# Altium footprint library 晶体管封装库.PcbLib: 101 footprints (part 6 of 7)
Each footprint in its own frame and in the unit in brackets; x right, y up, seen from the top. Pads: shape width x height; smd on the part's side, far side on the other; paste and mask are expansions set on the pad; w line width, h text height; cw(c..) or ccw(c..) is an arc to the next point about the centre after c.
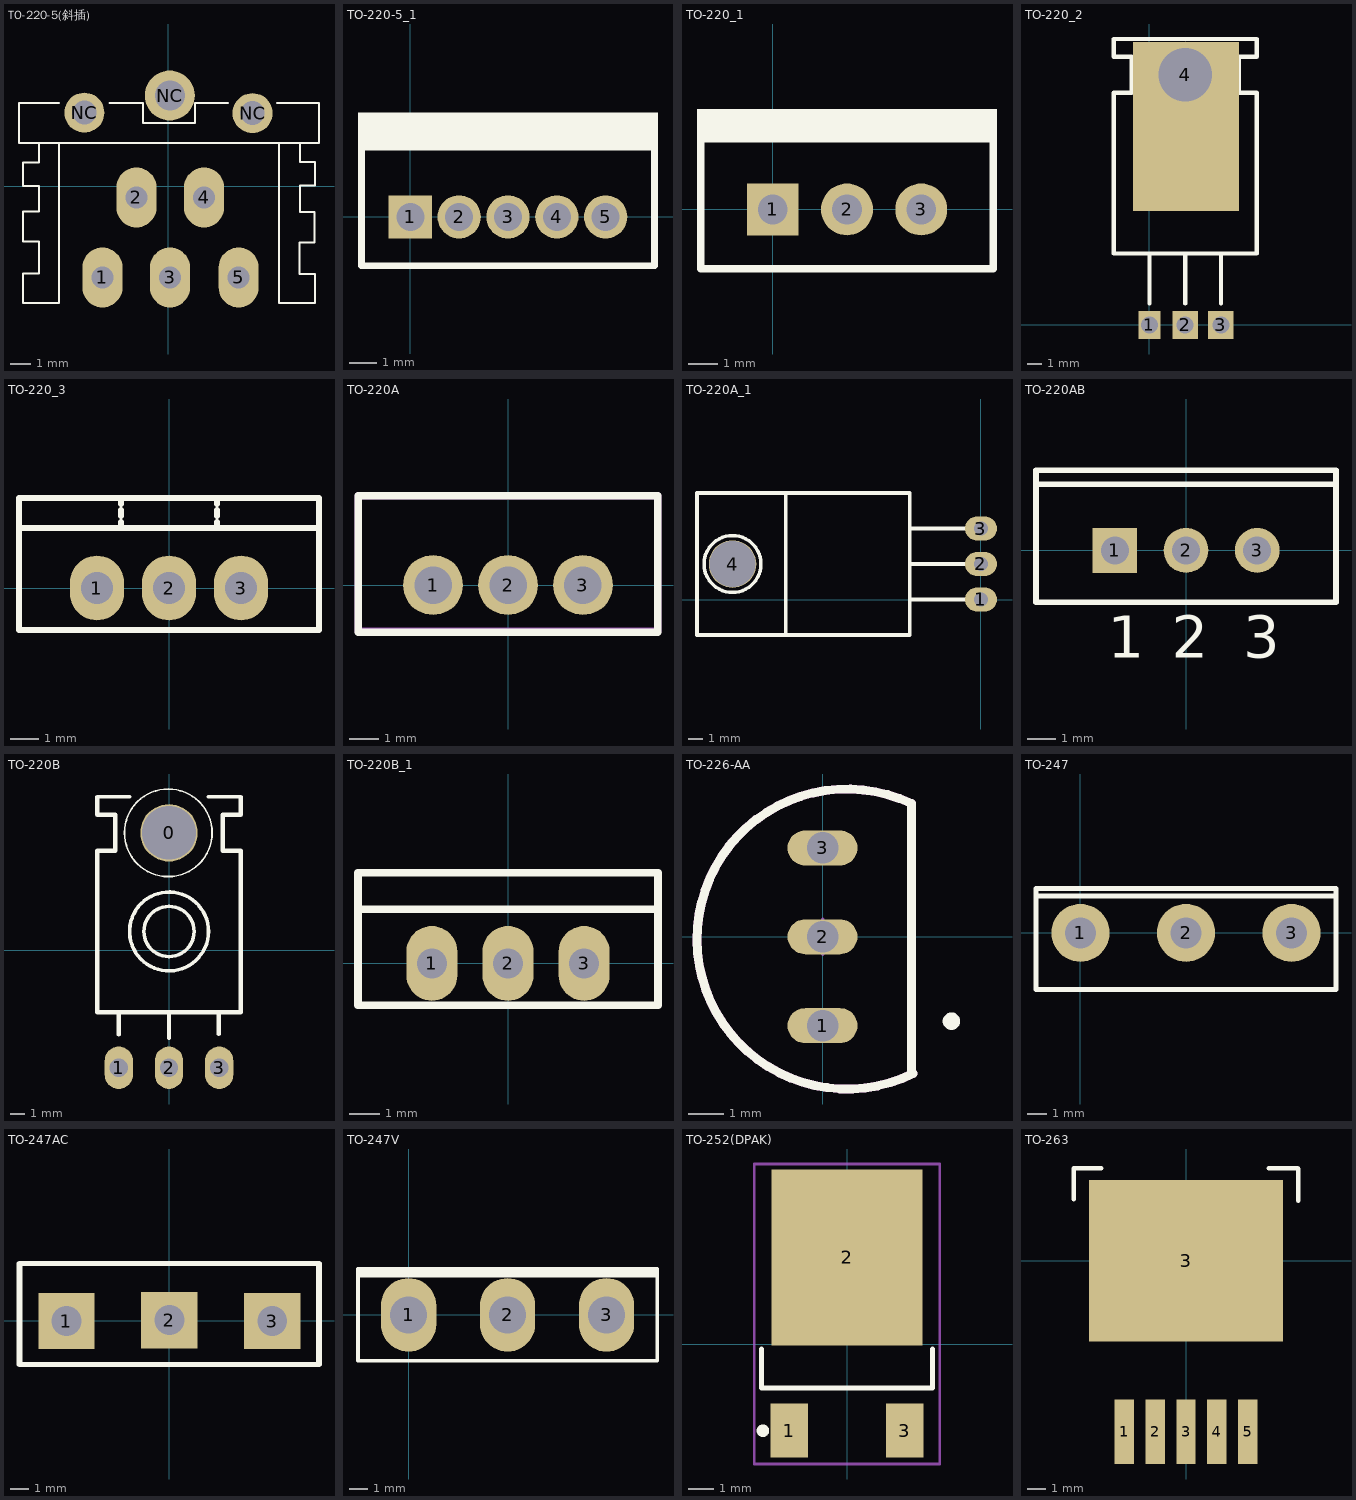
[diagram p5: the footprints below, top view; thin cyan lines are the x and y axes]

## TO-220-5(斜插) [mm]
pads (8):
  oval 2x3 hole 1.1: 1(-3.302,-4.549) 2(-1.602,-0.549) 3(0.076,-4.549) 4(1.778,-0.549) 5(3.505,-4.549)
  round 2 hole 1.2: NC(-4.204,3.696) NC(4.204,3.67)
  round 2.5 hole 1.5: NC(0.064,4.549)
Top Overlay:
  lines w0.1: -7.474,2.963 -7.474,2.179 ; -6.464,2.154 -6.464,1.206 -7.277,1.206 -7.277,0.013 -6.464,0.013 -6.464,-1.257 -7.277,-1.257 -7.277,-2.756 -6.464,-2.756 -6.464,-4.356 -7.277,-4.356 -7.277,-5.821 -5.474,-5.821 -5.474,2.179 ; -5.475,4.179 -7.474,4.179 -7.474,2.179 ; -4.674,4.179 -4.674,3.188 -4.666,3.179 -3.674,3.179 -3.674,4.179 ; -2.959,4.178 -1.283,4.178 ; -1.274,4.179 -1.274,3.179 1.326,3.179 ; 1.326,3.188 1.326,4.178 2.984,4.178 ; 3.726,4.179 3.726,3.188 4.718,3.188 4.726,3.179 4.726,4.179 ; 5.422,4.179 7.526,4.179 7.526,2.179 -7.474,2.179 ; 5.524,2.179 5.524,-5.821 7.328,-5.821 7.328,-4.381 6.54,-4.381 6.54,-2.807 7.302,-2.807 7.302,-1.283 6.566,-1.283 6.566,0.038 7.328,0.038 7.328,1.232 6.566,1.232 6.566,2.154
3D body: height 9, standoff 8, extent 1.194,-0.787 2.362,-0.381
3D body: height 9, standoff 8, extent -2.184,-0.762 -1.016,-0.356
3D body: height 8, standoff -2.1, extent 1.397,-0.787 2.159,-0.381
3D body: height 8, standoff -2.1, extent -1.981,-0.762 -1.219,-0.356
3D body: height 3.5, standoff -2.1, extent 3.124,-4.775 3.886,-4.369
3D body: height 23.5, standoff 17.5, extent -5.512,0.686 5.537,2.197
3D body: height 17.5, standoff 9, extent -5.486,-2.845 5.524,2.21
3D body: height 3.5, standoff -2.1, extent -3.683,-4.775 -2.921,-4.369
3D body: height 9, standoff 8, extent -3.912,-0.787 -2.743,-0.381
3D body: height 3.5, standoff -2.1, extent -0.305,-4.75 0.457,-4.343
3D body: height 9, standoff 8, extent -0.508,-0.762 0.66,-0.356
3D body: height 9, standoff 8, extent 2.921,-0.787 4.089,-0.381
3D body: height 25, standoff 0, extent -7.455,2.172 7.506,4.178
3D body: height 0, standoff -4, extent -4.686,3.188 -3.69,4.186
3D body: height 0, standoff -4, extent 3.746,3.213 4.743,4.211
3D body: height 25, standoff 0, extent -7.302,-5.829 -5.474,2.222
3D body: height 25, standoff 0, extent 5.524,-5.829 7.353,2.197
3D body: height 18.5, standoff 15.5, extent -1.422,1.648 1.566,4.648
3D body: height 3.5, standoff 3, extent -3.683,-4.775 -2.921,-0.381
3D body: height 3.5, standoff 3, extent 3.124,-4.775 3.886,-0.381
3D body: height 3.5, standoff 3, extent -0.305,-4.75 0.457,-0.356
3D body: height 8, standoff 3.5, extent -3.683,-0.787 -2.921,-0.381
3D body: height 8, standoff 3.5, extent -0.305,-0.762 0.457,-0.356
3D body: height 8, standoff 3.5, extent 3.124,-0.787 3.886,-0.381
3D body: height 2, standoff -4, extent -0.707,3.798 0.787,5.295

## TO-220-5_1 [mil]
pads (5):
  rect 62x62 hole 40: 1(0,0)
  round 62 hole 40: 2(70,0) 3(140,0) 4(210,0) 5(280,0)
Top Overlay:
  rectangle: -75,100 355,150
  lines w10: -70,-70 350,-70 350,100 -70,100 -70,-70

## TO-220_1 [mil]
pads (3):
  rect 70x70 hole 40: 1(0,0)
  round 70 hole 40: 2(100,0) 3(200,0)
Top Overlay:
  rectangle: -102,95 302,135
  lines w10: -97,-80 297,-80 297,95 -97,95 -97,-80

## TO-220_2 [mm]
pads (5):
  rect 1.575x2 hole 1.2: 1(0,0)
  rect 1.8x2 hole 1.2: 2(2.54,0) 3(5.08,0)
  round 4.7 hole 3.8: 4(2.54,17.78)
  rect 7.5x12 smd: ""(2.6,14.1)
Top Overlay:
  lines w0.305: 0,1.524 0,5.08 ; 2.54,1.524 2.54,5.08 ; 5.08,1.524 5.08,5.08 ; -2.54,5.08 7.62,5.08 7.62,16.51 6.35,16.51 6.35,19.05 7.62,19.05 7.62,20.32 -2.54,20.32 -2.54,19.05 -1.27,19.05 -1.27,16.51 -2.54,16.51 -2.54,5.08

## TO-220_3 [mil]
pads (3):
  oval 75x90 hole 45: 1(-100,0) 2(0,0) 3(100,0)
Top Overlay:
  lines w7.87: -66.67,83.33 -66.67,91.67 ; -66.67,100 -66.67,108.33 ; -66.67,116.67 -66.67,125 ; 66.67,83.33 66.67,91.67 ; 66.67,100 66.67,108.33 ; 66.67,116.67 66.67,125 ; -208.33,83.33 -208.33,125 208.33,125 208.33,83.33 ; -208.33,83.33 -208.33,-58.33 208.33,-58.33 208.33,83.33 ; -208.33,83.33 208.33,83.33

## TO-220A [mil]
pads (3):
  round 80 hole 50: 1(-100,0) 2(0,0) 3(100,0)
Top Overlay:
  lines w10: -200,-63 -200,0 -200,119 200,119 200,0 200,-63 -200,-63
Mechanical 15:
  lines w10: -200,-62 200,-62 200,119 -200,119 -200,-62
3D body: height 789.33, standoff -375.67, extent -205,-61.5 205,123.5

## TO-220A_1 [mm]
pads (4):
  oval 2.3x1.7 hole 1: 1(0.004,0.001) 2(0.004,2.541) 3(0.004,5.081)
  round 3.4 hole 3.3: 4(-17.775,2.537)
Top Overlay:
  circle w0.254: c-17.776,2.541 r2.032
  lines w0.254: -13.968,-2.537 -13.968,7.621 ; -5.076,0.001 0.004,0.001 ; -5.076,2.541 0.004,2.541 ; -5.076,5.081 0.004,5.081 ; -20.316,-2.539 -20.316,7.621 -5.076,7.621 -5.076,-2.539 -20.316,-2.539

## TO-220AB [mm] "TO, Thru-Hole, Vertical, Heatsink Mounted; 3 In-Line Leads; Pitch 2.54 mm"
height 19.3
pads (3):
  rect 1.6x1.6 hole 1: 1(-2.54,0)
  round 1.6 hole 1: 2(0,0) 3(2.54,0)
Top Overlay:
  lines w0.2: -5.35,2.35 5.35,2.35 ; -5.35,-1.85 -5.35,2.85 5.35,2.85 5.35,-1.85 -5.35,-1.85
  text "3" at 2.04,-3.825 h1.5
  text "1" at -2.79,-3.825 h1.5
  text "2" at -0.5,-3.825 h1.5
3D body: height 20.86, standoff -3, extent -5.36,-1.9 5.31,2.93

## TO-220B [mm]
pads (4):
  round 4.064 hole 3.81: 0(0,8.319)
  oval 2x3 hole 1.3: 1(-3.556,-8.319) 2(0,-8.319) 3(3.556,-8.319)
Top Overlay:
  circle w0.254: c0,1.333 r2.794
  circle w0.254: c0,1.333 r1.778
  circle w0.127: c-0.051,8.319 r3.1
  lines w0.254: -5.08,10.858 -2.794,10.858 ; 2.794,10.858 5.08,10.858
  lines w0.305: -5.08,10.858 -5.08,9.588 -3.81,9.588 -3.81,7.048 -5.08,7.049 -5.08,-4.381 5.08,-4.381 5.08,7.049 3.81,7.048 3.81,9.588 5.08,9.588 5.08,10.858 ; -3.556,-5.956 -3.556,-4.559 ; 0,-6.21 0,-4.381 ; 3.531,-5.931 3.531,-4.534
3D body: height 4.22, standoff -2.98, extent -5.029,-8.564 5.131,10.926

## TO-220B_1 [mm]
pads (3):
  oval 1.7x2.5 hole 1: 1(-2.546,-0.007) 2(-0.006,-0.007) 3(2.534,-0.007)
Top Overlay:
  lines w0.254: -5.01,1.796 4.997,1.796 ; -5.01,-1.404 4.997,-1.404 4.997,3.016 -5.01,3.016 -5.01,-1.404

## TO-226-AA [mm] "TO, Flat Index; 3 In-Line, Axial Leads; Body Dia. 4.8mm; Leads 0.55 x 0.51 mm (max)"
height 5.33
pads (3):
  oval 2x1 hole 0.9: 1(0,-2.54) 2(0,0) 3(0,2.54)
Top Overlay:
  circle w0.25: c3.685,-2.413 r0.125
  lines w0.254: 2.54,-3.81 2.54,3.81 ccw(c0.699,-0.064) 2.59,-3.913
Keep-Out Layer:
  lines w0.254: 2.54,-3.81 2.54,3.81 ccw(c0.699,-0.064) 2.59,-3.913
Mechanical 15:
  lines w0.1: -0.619,0 0.381,0 ; 0,-0.5 0,0.5

## TO-247 [mm]
height 0.9
pads (3):
  round 3 hole 1.6: 1(0,0) 2(5.45,0) 3(10.9,0)
Top Overlay:
  lines w0.254: -2.297,1.905 13.07,1.905 ; -2.297,-2.921 13.197,-2.921 13.197,2.286 -2.297,2.286 -2.297,-2.921
3D body: height 26.16, standoff -15.75, extent -2.644,-3.192 13.616,2.108

## TO-247AC [mm]
pads (3):
  rect 3x3 hole 1.6: 1(-5.5,-0.023) 2(0,0.024) 3(5.5,-0.023)
Top Overlay:
  lines w0.152: -8.033,2.547 -8.001,2.515 ; 7.967,2.166 7.999,2.134
  lines w0.254: -8.001,-2.337 7.999,-2.337 ; -8.001,3.048 7.999,3.048
  lines w0.305: -8.001,-2.337 -8.001,3.048 ; 7.999,-2.337 7.999,3.048
3D body: height 25.35, standoff -11.45, extent -7.976,-2.261 7.894,3.049

## TO-247V [mil]
pads (3):
  oval 120x160 hole 80: 1(0,0) 2(215,0) 3(430,0)
Top Overlay:
  rectangle: -109.96,81.58 541.73,103.74
  lines w7.87: -110,-100 -110,100 540,100 540,-100 -110,-100
3D body: height 1102.36, standoff -316.86, extent -97.05,-105 525,104.06

## TO-252(DPAK) [mm]
pads (3):
  rect 1.5x2.15 smd: 1(-2.3,-3.45) 3(2.3,-3.45)
  rect 6x7 smd: 2(0,3.45)
Top Overlay:
  circle w0.25: c-3.35,-3.45 r0.125
  lines w0.2: -3.4,-0.2 -3.4,-1.75 3.4,-1.75 3.4,-0.2
Mechanical 15:
  lines w0.1: -0.5,0.95 0.5,0.95 ; 0,0.45 0,1.45 ; -3.7,-4.775 -3.7,7.173 3.7,7.173 3.7,-4.775 -3.7,-4.775
3D body: height 2.39, standoff -0.02, extent -3.238,-3.953 3.302,5.985

## TO-263 [mil]
pads (6):
  rect 42x140 smd: 1(-134,-370) 2(-67,-370) 3(0,-370) 4(67,-370) 5(134,-370)
  rect 420x350 smd: 3(0,0)
Top Overlay:
  lines w10: -243,134 -243,201 -184,201 ; 179,201 242,201 243,200 243,130